# Altium footprint library My Library.PcbLib: 872 footprints (part 17 of 55)
Each footprint in its own frame and in the unit in brackets; x right, y up, seen from the top. Pads: shape width x height; smd on the part's side, far side on the other; paste and mask are expansions set on the pad; w line width, h text height; cw(c..) or ccw(c..) is an arc to the next point about the centre after c.
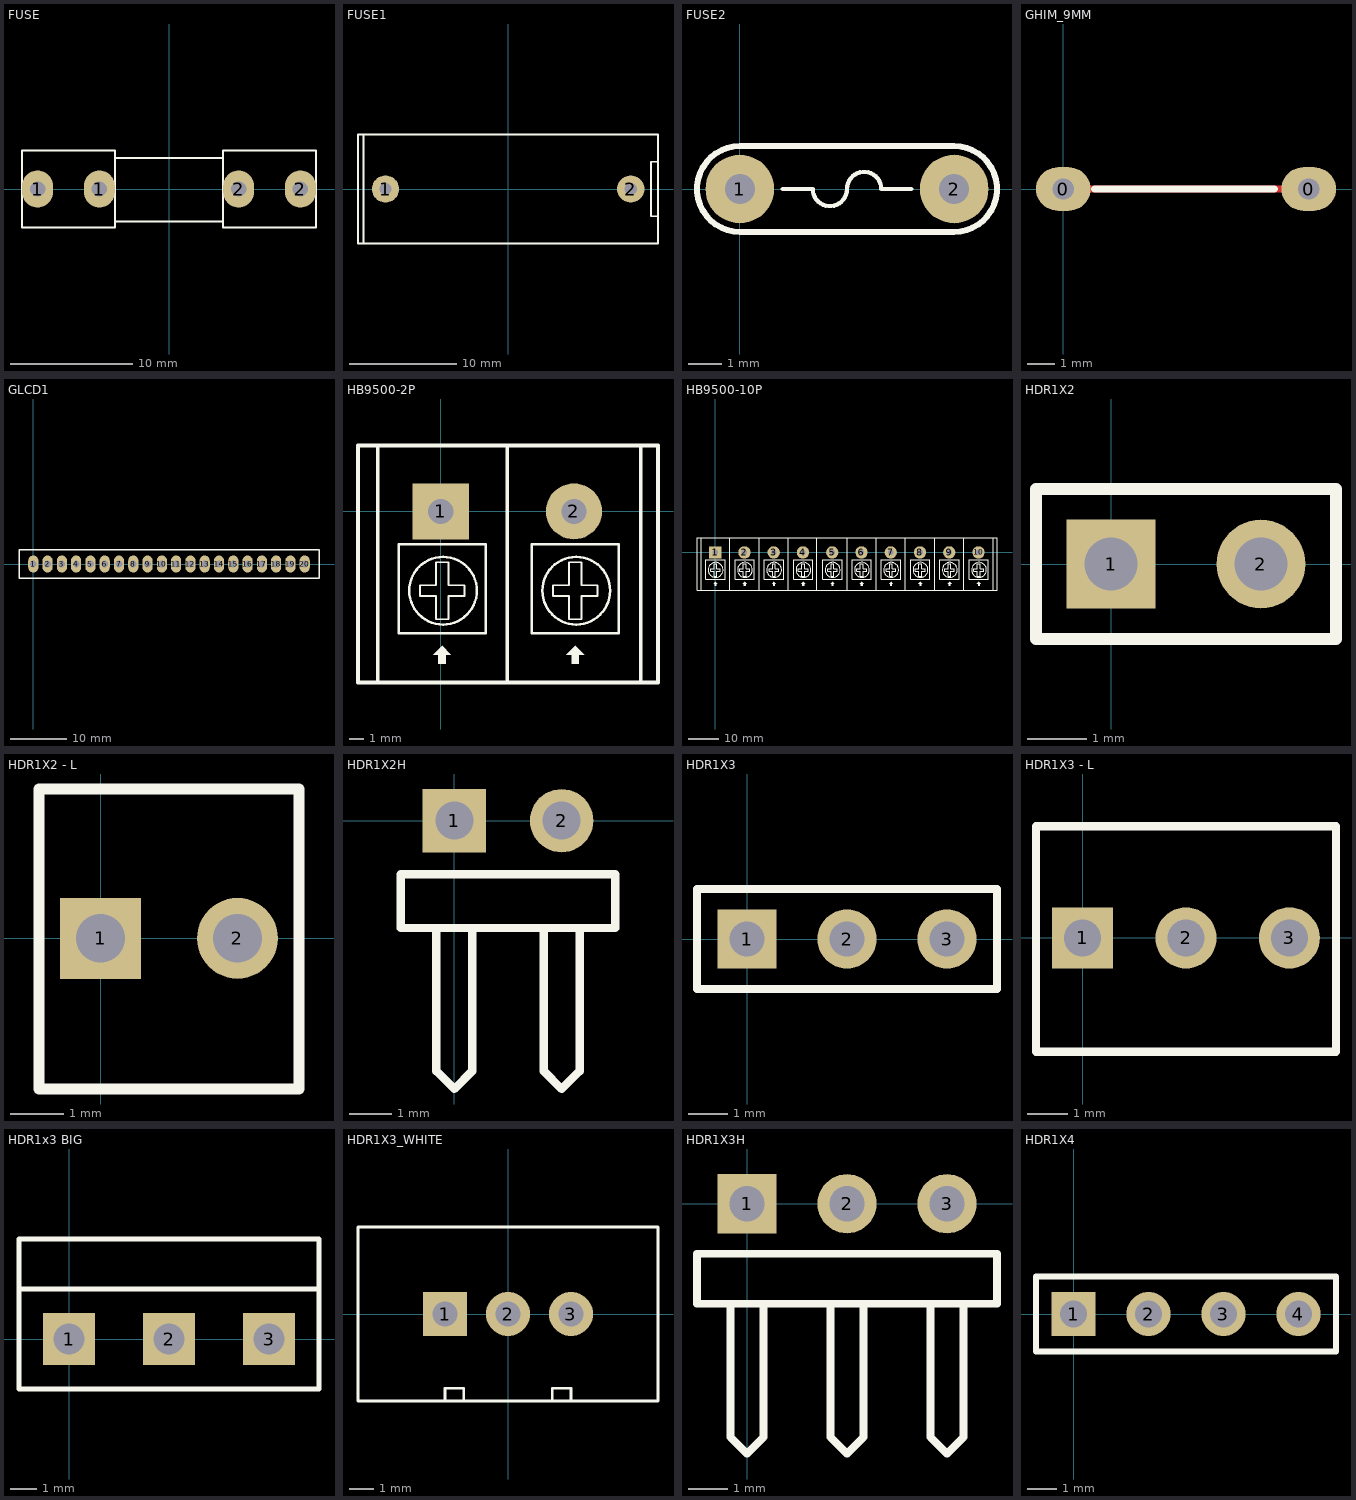
[diagram p16: the footprints below, top view; thin cyan lines are the x and y axes]

## FUSE [mil] "De Fuse"
pads (4):
  oval 100x120 hole 50: 1(-425,0) 1(-225,0) 2(225,0) 2(425,0)
Top Overlay:
  lines w7: -175,-105 175,-105 ; -175,100 175,100 ; -475,-125 -175,-125 -175,125 -475,125 -475,-125 ; 175,-125 175,125 475,125 475,-125 175,-125
3D body "SW3dPS-Fuse Leg_2009.STEP": height 377.88, standoff -129.94, extent -448,-117 -208,126.71
3D body "SW3dPS-Fuse Small 1A.STEP": height 370.39, standoff 169.61, extent -384.8,-98 390.8,102.79
3D body "SW3dPS-Fuse Leg_2009.STEP": height 377.88, standoff -129.94, extent 219,-116.71 459,127

## FUSE1 [mil] "De Fuse Box"
pads (2):
  round 100 hole 45: 1(-450,0) 2(450,0)
Top Overlay:
  lines w7: -531,-199 -531,200 ; 549,-100 525,-100 524,-99 524,100 550,100 ; -551,-200 -551,200 550,200 550,-200 -551,-200

## FUSE2 [mil] "Fuse"
pads (2):
  round 80 hole 35: 1(0,0) 2(250,0)
Top Overlay:
  lines w5: 50,0 85,0 ccw(c105,0) 125,0 cw(c145,0) 165,0 200,0
  lines w7: 0,-50 cw(c0,0) 0,50 250,50 cw(c250,0) 250,-50 0,-50

## GHIM_9MM [mm]
pads (2):
  oval 2x1.6 hole 0.787: 0(0,0) 0(9,0)
Top Layer:
  lines w0.254: 0,0 9,0
Top Overlay:
  lines w0.254: 1.143,0 7.747,0

## GLCD1 [mm]
pads (20):
  oval 1.8x3 hole 1.2: 1(0,0) 2(2.54,0) 3(5.08,0) 4(7.62,0) 5(10.16,0) 6(12.7,0) 7(15.24,0) 8(17.78,0) 9(20.32,0) 10(22.86,0) 11(25.4,0) 12(27.94,0) 13(30.48,0) 14(33.02,0) 15(35.56,0) 16(38.1,0) 17(40.64,0) 18(43.18,0) 19(45.72,0) 20(48.26,0)
Top Overlay:
  lines w0.254: -2.54,-2.54 -2.54,2.54 50.8,2.54 50.8,-2.54 -2.54,-2.54

## HB9500-2P [mm]
pads (2):
  rect 4x4 hole 1.8: 1(0,0)
  round 4 hole 1.8: 2(9.5,0)
Top Overlay:
  circle w0.178: c9.663,-5.652 r2.413
  circle w0.178: c0.163,-5.652 r2.413
  region: 9.594,-9.588 8.959,-10.223 9.34,-10.223 9.34,-10.858 9.848,-10.858 9.848,-10.223 10.229,-10.223
  region: 0.094,-9.588 -0.541,-10.223 -0.16,-10.223 -0.16,-10.858 0.348,-10.858 0.348,-10.223 0.729,-10.223
  lines w0.127: -1.488,-6.033 -0.345,-6.033 -0.345,-7.684 0.544,-7.684 0.544,-6.033 1.687,-6.033 1.687,-5.271 0.544,-5.271 0.544,-3.62 -0.345,-3.62 -0.345,-5.271 -1.488,-5.271 -1.488,-6.033 ; 8.012,-6.033 9.155,-6.033 9.155,-7.684 10.044,-7.684 10.044,-6.033 11.187,-6.033 11.187,-5.271 10.044,-5.271 10.044,-3.62 9.155,-3.62 9.155,-5.271 8.012,-5.271 8.012,-6.033
  lines w0.178: -3.012,-8.7 -3.012,-2.35 3.211,-2.35 3.211,-8.7 -3.012,-8.7 ; 6.488,-8.7 6.488,-2.35 12.711,-2.35 12.711,-8.7 6.488,-8.7
  lines w0.254: -4.5,-12.2 -4.5,4.7 ; 4.75,-12.2 4.75,4.7 ; 14.25,-12.2 14.25,4.7 ; -5.9,-12.2 -5.9,4.7 15.494,4.7 15.494,-12.2 -5.9,-12.2
3D body "User Library-Screw terminal block 9_5mm.STEP": height 18.51, standoff -4.99, extent -5.725,-12 15.325,4.5

## HB9500-10P [mm]
pads (10):
  rect 4x4 hole 1.8: 1(0,0)
  round 4 hole 1.8: 2(9.5,0) 3(19,0) 4(28.5,0) 5(38,0) 6(47.5,0) 7(57,0) 8(66.5,0) 9(76,0) 10(85.5,0)
Top Overlay:
  drawing of 195 lines, arcs and shapes, not listed
3D body "User Library-Screw terminal block 9_5mm.STEP": height 18.51, standoff -4.99, extent 13.275,-12 34.325,4.5
3D body "User Library-Screw terminal block 9_5mm.STEP": height 18.51, standoff -4.99, extent -5.725,-12 15.325,4.5
3D body "User Library-Screw terminal block 9_5mm.STEP": height 18.51, standoff -4.99, extent 32.275,-12 53.325,4.5
3D body "User Library-Screw terminal block 9_5mm.STEP": height 18.51, standoff -4.99, extent 51.275,-12 72.325,4.5
3D body "User Library-Screw terminal block 9_5mm.STEP": height 18.51, standoff -4.99, extent 70.275,-12 91.325,4.5

## HDR1X2 [mm] "Connector; Header; 2 Position"
pads (2):
  rect 1.5x1.5 hole 0.9: 1(0,0)
  round 1.5 hole 0.9: 2(2.54,0)
Top Overlay:
  lines w0.2: -1.27,-1.27 -1.27,1.27 3.81,1.27 3.81,-1.27 -1.27,-1.27
3D body: height 1.5, standoff 0, extent 1.27,-1.27 3.81,1.27
3D body: height 7, standoff -1, extent 2.134,-0.406 2.93,0.392
3D body: height 7, standoff -1, extent -0.406,-0.406 0.39,0.392
3D body: height 1.5, standoff 0, extent -1.27,-1.27 1.27,1.27

## HDR1X2 - L [mm] "Connector; Header; 2 Position"
pads (2):
  rect 1.5x1.5 hole 0.9: 1(0,0)
  round 1.5 hole 0.9: 2(2.54,0)
Top Overlay:
  lines w0.2: -1.143,-2.794 3.683,-2.794 3.683,2.769 -1.143,2.769 -1.143,-2.794
3D body "h2.stp": height 11.72, standoff -3.54, extent -1.27,-2.92 3.81,2.88

## HDR1X2H [mm] "Connector; Header; 2 Position; Right Angle"
pads (2):
  rect 1.5x1.5 hole 0.9: 1(0,0)
  round 1.5 hole 0.9: 2(2.54,0)
Top Overlay:
  lines w0.2: -0.423,-2.54 -0.423,-5.927 0,-6.35 0.423,-5.927 0.423,-2.54 ; 2.117,-2.54 2.117,-5.927 2.54,-6.35 2.963,-5.927 2.963,-2.54 ; -1.27,-2.54 3.81,-2.54 3.81,-1.27 -1.27,-1.27 -1.27,-2.54
3D body "User Library-0_1inch 2 pin strip right angle.step": height 4.33, standoff -3, extent -1.27,-7 3.81,1.27

## HDR1X3 [mm] "Connector; Header; 3 Position"
pads (3):
  rect 1.5x1.5 hole 0.9: 1(0,0)
  round 1.5 hole 0.9: 2(2.54,0) 3(5.08,0)
Top Overlay:
  lines w0.2: -1.27,-1.27 -1.27,1.27 ; -1.27,-1.27 6.35,-1.27 6.35,1.27 -1.27,1.27 ; -1.27,-1.27 -1.27,1.27
3D body: height 1.5, standoff 0, extent -1.27,-1.27 1.27,1.27
3D body: height 7, standoff -1, extent -0.406,-0.406 0.39,0.392
3D body: height 1.5, standoff 0, extent 1.27,-1.27 3.81,1.27
3D body: height 7, standoff -1, extent 2.134,-0.406 2.93,0.392
3D body: height 1.5, standoff 0, extent 3.81,-1.27 6.35,1.27
3D body: height 7, standoff -1, extent 4.674,-0.406 5.47,0.392

## HDR1X3 - L [mm] "Connector; Header; 3 Position"
pads (3):
  rect 1.5x1.5 hole 0.9: 1(0,0)
  round 1.5 hole 0.9: 2(2.54,0) 3(5.08,0)
Top Overlay:
  lines w0.2: -1.143,-2.794 -1.143,2.743 6.223,2.743 6.223,-2.794 -1.143,-2.794
3D body "h3.stp": height 11.72, standoff -3.54, extent -1.27,-2.92 6.35,2.88

## HDR1x3 BIG [mm] "3 chan cam 7805, BJT to, FET to..."
pads (3):
  rect 2x2 / inner round 1.575 / far side rect 2x2 hole 1.2: 1(0,0) 2(3.81,0) 3(7.62,0)
Top Overlay:
  lines w0.2: -1.905,1.905 9.525,1.905 ; -1.905,-1.905 -1.905,2.54 -1.905,3.81 9.525,3.81 9.525,-1.905 -1.905,-1.905

## HDR1X3_WHITE [mil]
pads (3):
  rect 70x70 hole 40: 1(-100,0)
  round 70 hole 40: 2(0,0) 3(100,0)
Top Overlay:
  lines w4: -238.11,6 -238.11,81 ; -100,-136.22 -100,-118.11 -70,-118.11 -70,-136.22 ; -86,138.11 -11,138.11 ; -48,-138.11 27,-138.11 ; 14,-138.11 -238.11,-138.11 ; 70,-136.22 70,-118.11 100,-118.11 100,-136.22 ; 238.11,13 238.11,88 ; -238.11,-138.11 238.11,-138.11 238.11,138.11 -238.11,138.11 -238.11,-138.11
3D body: height 39.37, standoff 0, extent -218.09,-118.11 218.11,118.11
3D body: height 196.85, standoff 35.43, extent -218.09,-118.16 218.11,118.11
3D body: height 196.85, standoff 35.43, extent -70,-120 68.9,-99.95
3D body: height 118.11, standoff 35.43, extent -100,-120 -70,-100
3D body: height 118.11, standoff 35.43, extent 68.9,-118.16 100,-99.95
3D body: height 177.17, standoff -39.37, extent -113.5,-12.5 -85.9,13.2
3D body: height 177.17, standoff -39.37, extent -13.5,-12.5 14.1,13.2
3D body: height 177.17, standoff -39.37, extent 86.5,-12.5 114.1,13.2

## HDR1X3H [mm] "Connector; Header; 3 Position; Right Angle"
pads (3):
  rect 1.5x1.5 hole 0.9: 1(0,0)
  round 1.5 hole 0.9: 2(2.54,0) 3(5.08,0)
Top Overlay:
  lines w0.2: -0.423,-2.54 -0.423,-5.927 0,-6.35 0.423,-5.927 0.423,-2.54 ; 2.117,-2.54 2.117,-5.927 2.54,-6.35 2.963,-5.927 2.963,-2.54 ; 4.657,-2.54 4.657,-5.927 5.08,-6.35 5.503,-5.927 5.503,-2.54 ; -1.27,-2.54 -1.27,-1.27 6.35,-1.27 6.35,-2.54 -1.27,-2.54
3D body "User Library-0_1inch 3pin strip right angle.step": height 4.33, standoff -3, extent -1.27,-7 6.35,1.27

## HDR1X4 [mm] "Connector; Header; 4 Position"
pads (4):
  rect 1.5x1.5 hole 0.9: 1(0,0)
  round 1.5 hole 0.9: 2(2.54,0) 3(5.08,0) 4(7.62,0)
Top Overlay:
  lines w0.2: -1.27,-1.27 -1.27,1.27 8.89,1.27 8.89,-1.27 -1.27,-1.27
3D body: height 7, standoff -1, extent -0.406,-0.406 0.39,0.392
3D body: height 1.5, standoff 0, extent -1.27,-1.27 1.27,1.27
3D body: height 7, standoff -1, extent 2.134,-0.406 2.93,0.392
3D body: height 1.5, standoff 0, extent 1.27,-1.27 3.81,1.27
3D body: height 7, standoff -1, extent 4.674,-0.406 5.47,0.392
3D body: height 1.5, standoff 0, extent 3.81,-1.27 6.35,1.27
3D body: height 7, standoff -1, extent 7.214,-0.406 8.01,0.392
3D body: height 1.5, standoff 0, extent 6.35,-1.27 8.89,1.27